# Altium footprint library Common Components.PcbLib: 94 footprints (part 2 of 6)
Each footprint in its own frame and in the unit in brackets; x right, y up, seen from the top. Pads: shape width x height; smd on the part's side, far side on the other; paste and mask are expansions set on the pad; w line width, h text height; cw(c..) or ccw(c..) is an arc to the next point about the centre after c.
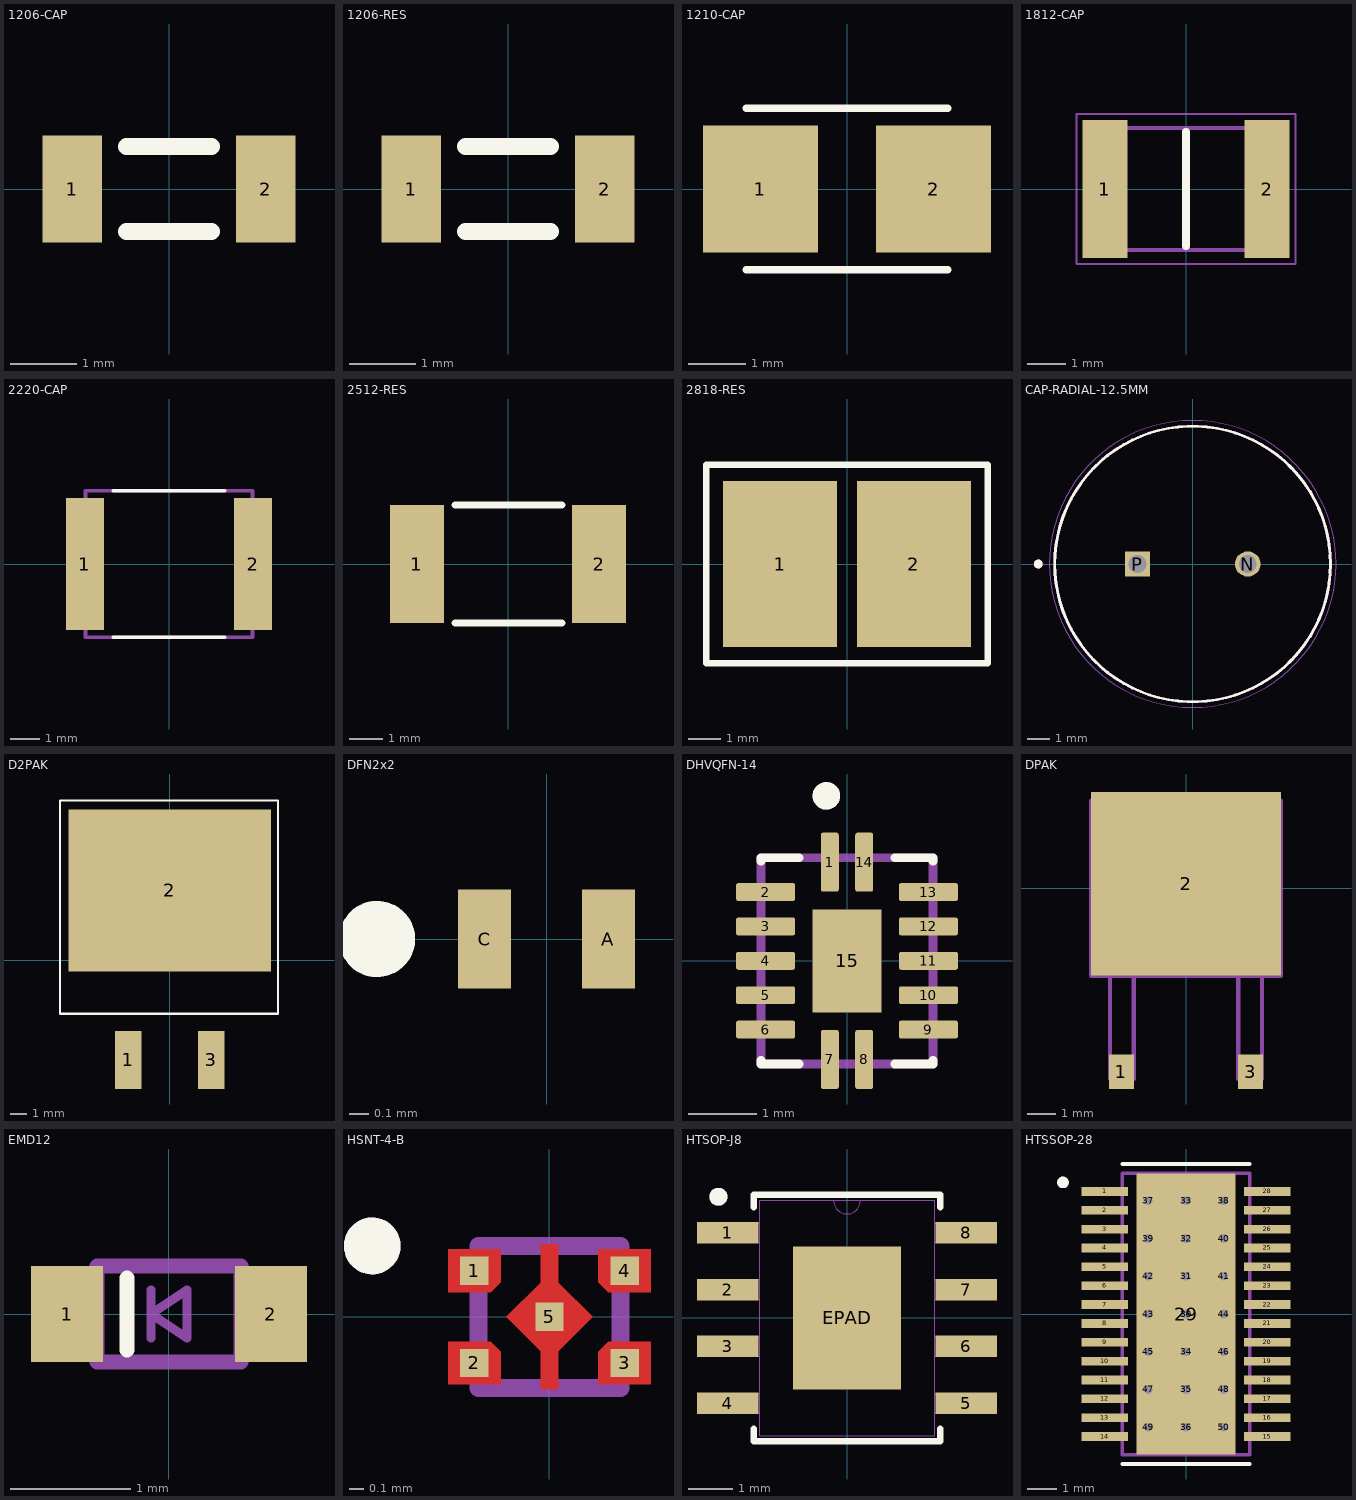
[diagram p1: the footprints below, top view; thin cyan lines are the x and y axes]

## 1206-CAP [mil]
pads (2):
  rect 35x63 smd: 1(-57,0) 2(57,0)
Top Overlay:
  lines w10: -25,-25 25,-25 ; -25,25 25,25
3D body "CAP_1206.step": height 31.21, standoff 0.5, extent -63,-31.5 62.99,31.49

## 1206-RES [mil]
pads (2):
  rect 35x63 smd: 1(-57,0) 2(57,0)
Top Overlay:
  lines w10: -25,-25 25,-25 ; -25,25 25,25
3D body "RES_1206.step": height 24.13, standoff 0.5, extent -63,-31.49 62.99,31.5

## 1210-CAP [mm]
pads (2):
  rect 2x2.2 smd: 1(-1.5,0) 2(1.5,0)
Top Overlay:
  lines w0.127: -1.75,-1.4 1.75,-1.4 ; -1.75,1.4 1.75,1.4
3D body "CAP_1210.step": height 0.79, standoff 0.01, extent -1.6,-1.25 1.6,1.25

## 1812-CAP [mm]
pads (2):
  rect 1.18x3.61 smd: 1(-2.12,0) 2(2.12,0)
Top Overlay:
  lines w0.2: 0,-1.5 0,1.5
Mechanical 13:
  lines w0.1: -2.3,-1.6 -2.3,1.6 2.3,1.6 2.3,-1.6 -2.3,-1.6
Mechanical 15:
  lines w0.05: -2.86,-1.96 -2.86,1.96 2.86,1.96 2.86,-1.96 -2.86,-1.96
3D body "1812B105K251CT.stp": height 2.2, standoff 0, extent -2.3,-1.6 2.3,1.6

## 2220-CAP [mm]
pads (2):
  rect 1.3x4.5 smd mask+0: 1(-2.875,0) 2(2.875,0)
Top Overlay:
  lines w0.127: -1.905,-2.5 1.905,-2.5 ; -1.905,2.5 1.905,2.5
Top Solder:
  region: 3.525,-2.25 2.225,-2.25 2.225,2.25 3.525,2.25
  region: -2.225,-2.25 -3.525,-2.25 -3.525,2.25 -2.225,2.25
Mechanical 13:
  lines w0.127: -2.85,-2.5 -2.85,2.5 2.85,2.5 2.85,-2.5 -2.85,-2.5
3D body "CAP_2220.step": height 1.01, standoff 0.01, extent -2.8,-2.5 2.8,2.5

## 2512-RES [mm]
pads (2):
  rect 1.6x3.5 smd: 1(-2.7,0) 2(2.7,0)
Top Overlay:
  lines w0.2: -1.575,-1.75 1.6,-1.75 ; -1.575,1.75 1.6,1.75
3D body "RES_2512.step": height 0.61, standoff 0.01, extent -3.2,-1.6 3.2,1.6

## 2818-RES [mm]
pads (2):
  rect 3.5x5.1 smd: 1(-2.055,0) 2(2.055,0)
Top Overlay:
  lines w0.2: -4.318,-3.048 -4.318,0.563 -4.318,3.048 4.318,3.048 4.318,-3.048 1.329,-3.048 -1.329,-3.048 -4.318,-3.048
3D body "WSHP2818.stp": height 1.51, standoff 0.01, extent -3.55,-2.286 3.55,2.314

## CAP-RADIAL-12.5MM [mm]
pads (2):
  round 1.15 hole 0.8: N(2.5,0)
  rect 1.15x1.15 hole 0.8: P(-2.5,0)
Top Overlay:
  circle w0.127: c0,0 r6.25
  circle w0.2: c-7,0 r0.1
Mechanical 13:
  circle w0.127: c0,0 r6.25
  circle w0.2: c-7,0 r0.1
Mechanical 15:
  circle w0.05: c0,0 r6.5
3D body "step_temp.STEP": height 27, standoff -19, extent -6.25,-6.25 6.25,6.25

## D2PAK [mm]
pads (3):
  rect 1.6x3.5 smd: 1(-2.5,-6) 3(2.5,-6)
  rect 12.2x9.75 smd: 2(0,4.2)
Top Overlay:
  lines w0.127: -6.6,-3.22 6.5,-3.22 6.5,9.6 -6.6,9.6 -6.6,-3.22
3D body "D2PAK.step": height 4.78, standoff -0.24, extent -5.08,-6.749 5.08,8.514

## DFN2x2 [mm]
pads (2):
  rect 0.28x0.52 smd: A(0.325,0) C(-0.325,0)
Top Overlay:
  circle w0.2: c-0.889,0 r0.1
3D body "X2DFN-2.STEP": height 0.53, standoff 0, extent -0.5,-0.3 0.5,0.3

## DHVQFN-14 [mm]
pads (15):
  rrect25% 0.26x0.86 smd: 1(-0.25,1.435) 7(-0.25,-1.435) 8(0.25,-1.435) 14(0.25,1.435)
  rrect25% 0.86x0.26 smd: 2(-1.185,1) 3(-1.185,0.5) 4(-1.185,0) 5(-1.185,-0.5) 6(-1.185,-1) 9(1.185,-1) 10(1.185,-0.5) 11(1.185,0) 12(1.185,0.5) 13(1.185,1)
  rect 1x1.5 smd paste-2: 15(0,0)
Top Overlay:
  circle w0.2: c-0.3,2.4 r0.1
  lines w0.127: -1.25,-1.45 -1.25,-1.5 -0.7,-1.5 ; -1.25,1.45 -1.25,1.5 -0.7,1.5 ; 0.7,-1.5 1.25,-1.5 1.25,-1.45 ; 0.7,1.5 1.25,1.5 1.25,1.45
Top Paste:
  region: 0.32,-0.47 -0.32,-0.47 -0.32,0.47 0.32,0.47
Mechanical 13:
  circle w0.2: c-0.3,2.4 r0.1
  lines w0.127: -1.25,-1.5 -1.25,1.5 1.25,1.5 1.25,-1.5 -1.25,-1.5
3D body "SOT762-1.step": height 0.86, standoff 0.01, extent -1.25,-1.501 1.252,1.501

## DPAK [mil]
pads (3):
  rect 35x48 smd: 1(-90,-256) 3(90,-256)
  rect 265x256 smd: 2(0,6)
Mechanical 13:
  lines w6: -132,-122 132,-122 132,122 -132,122 -132,-122 ; -106,-266 -106,-122 -73,-122 -73,-266 -106,-266 ; 73,-266 73,-122 106,-122 106,-266 73,-266
3D body "DPAK.step": height 95.42, standoff 0.5, extent -131.88,-277.31 131.9,130.26

## EMD12 [mm]
pads (2):
  rect 0.6x0.8 smd: 1(-0.85,0) 2(0.85,0)
Top Overlay:
  lines w0.127: -0.35,-0.3 -0.35,0.3
Mechanical 13:
  lines w0.076: -0.15,-0.2 -0.15,0.2 ; -0.15,0 0.15,0.2 0.15,-0.2 -0.15,0
  lines w0.127: -0.6,-0.4 -0.6,0.4 0.6,0.4 0.6,-0.4 -0.6,-0.4
3D body "EMD2.step": height 0.72, standoff 0, extent -0.859,-0.415 0.843,0.397

## HSNT-4-B [mm]
pads (5):
  rect 0.2x0.2 smd paste-1 mask+0: 1(-0.53,0.325) 2(-0.53,-0.325) 3(0.53,-0.325) 4(0.53,0.325)
  rect 0.2x0.2 smd paste+0.036 mask+0: 5(0,0)
Top Layer:
  region: 0.062,0.242 0.304,0 0.062,-0.242 0.062,-0.51 -0.062,-0.51 -0.062,-0.242 -0.304,0 -0.062,0.242 -0.062,0.51 0.062,0.51
  region: -0.345,-0.245 -0.345,-0.475 -0.715,-0.475 -0.715,-0.175 -0.415,-0.175
  region: 0.715,0.175 0.415,0.175 0.345,0.245 0.345,0.475 0.715,0.475
  region: 0.715,-0.475 0.345,-0.475 0.345,-0.245 0.415,-0.175 0.715,-0.175
  region: -0.345,0.245 -0.415,0.175 -0.715,0.175 -0.715,0.475 -0.345,0.475
Top Overlay:
  circle w0.2: c-1.25,0.5 r0.1
Top Paste:
  region: -0.345,-0.245 -0.345,-0.475 -0.715,-0.475 -0.715,-0.175 -0.415,-0.175
  region: 0.715,0.175 0.415,0.175 0.345,0.245 0.345,0.475 0.715,0.475
  region: 0.715,-0.475 0.345,-0.475 0.345,-0.245 0.415,-0.175 0.715,-0.175
  region: -0.345,0.245 -0.415,0.175 -0.715,0.175 -0.715,0.475 -0.345,0.475
Top Solder:
  region: 0.112,0.262 0.375,0 0.112,-0.262 0.112,-0.56 -0.112,-0.56 -0.112,-0.262 -0.375,0 -0.112,0.262 -0.112,0.56 0.112,0.56
  region: -0.295,-0.195 -0.295,-0.525 -0.765,-0.525 -0.765,-0.125 -0.365,-0.125
  region: 0.765,0.125 0.365,0.125 0.295,0.195 0.295,0.525 0.765,0.525
  region: 0.765,-0.525 0.295,-0.525 0.295,-0.195 0.365,-0.125 0.765,-0.125
  region: -0.295,0.195 -0.365,0.125 -0.765,0.125 -0.765,0.525 -0.295,0.525
Mechanical 13:
  circle w0.2: c-1.25,0.5 r0.1
  lines w0.127: -0.5,-0.5 -0.5,0.5 0.5,0.5 0.5,-0.5 -0.5,-0.5
3D body "HSNT-4-B.STEP": height 0.38, standoff 0, extent -0.53,-0.505 0.53,0.505

## HTSOP-J8 [mil]
pads (9):
  rect 54x19 smd paste+0: 1(-105,75) 2(-105,25) 3(-105,-25) 4(-105,-75) 5(105,-75) 6(105,-25) 7(105,25) 8(105,75)
  rect 95x126 smd paste-62.5: EPAD(0,0)
Top Overlay:
  circle w7.87: c-113.13,106.67 r3.94
  lines w6: -82,-97.6 -82,-108.5 82,-108.5 82,-97.6 ; -82,97.6 -82,108.5 82,108.5 82,97.6
Top Paste:
  region: 43.56,59.06 -43.56,59.06 -43.56,3.94 43.56,3.94
  region: 43.56,-3.94 -43.56,-3.94 -43.56,-59.06 43.56,-59.06
Mechanical 13:
  circle w7.87: c-113.13,106.67 r3.94
  circle w7.87: c-113.13,106.67 r3.94
  lines w0: -12,103.5 ccw(c0,103.5) 12,103.5
  lines w1: -118,-83.5 -118,-66.5 -77,-66.5 -77,-83.5 -118,-83.5 ; -118,-33.5 -118,-16.5 -77,-16.5 -77,-33.5 -118,-33.5 ; -118,16.5 -118,33.5 -77,33.5 -77,16.5 -118,16.5 ; -118,66.5 -118,83.5 -77,83.5 -77,66.5 -118,66.5 ; -77,-103.5 77,-103.5 77,103.5 -77,103.5 -77,-103.5 ; 77,-83.5 77,-66.5 118,-66.5 118,-83.5 77,-83.5 ; 77,-33.5 77,-16.5 118,-16.5 118,-33.5 77,-33.5 ; 77,16.5 77,33.5 118,33.5 118,16.5 77,16.5 ; 77,66.5 77,83.5 118,83.5 118,66.5 77,66.5
3D body: height 10, standoff 0, extent 0,0 10,10
3D body "HTSOP-J8_ROM.step": height 39.09, standoff 0, extent -118,-103.5 117.99,103.5

## HTSSOP-28 [mm]
pads (50):
  rect 1.6x0.3 smd: 1(-2.8,4.225) 2(-2.8,3.575) 3(-2.8,2.925) 4(-2.8,2.275) 5(-2.8,1.625) 6(-2.8,0.975) 7(-2.8,0.325) 8(-2.8,-0.325) 9(-2.8,-0.975) 10(-2.8,-1.625) 11(-2.8,-2.275) 12(-2.8,-2.925) 13(-2.8,-3.575) 14(-2.8,-4.225) 15(2.8,-4.225) 16(2.8,-3.575) 17(2.8,-2.925) 18(2.8,-2.275) 19(2.8,-1.625) 20(2.8,-0.975) 21(2.8,-0.325) 22(2.8,0.325) 23(2.8,0.975) 24(2.8,1.625) 25(2.8,2.275) 26(2.8,2.925) 27(2.8,3.575) 28(2.8,4.225)
  rect 3.4x9.7 smd: 29(0,0)
  round 0.5 hole 0.3: 30(0,0) 31(0,1.3) 32(0,2.6) 33(0,3.9) 34(0,-1.3) 35(0,-2.6) 36(0,-3.9) 37(-1.3,3.9) 38(1.3,3.9) 39(-1.3,2.6) 40(1.3,2.6) 41(1.3,1.3) 42(-1.3,1.3) 43(-1.3,0) 44(1.3,0) 45(-1.3,-1.3) 46(1.3,-1.3) 47(-1.3,-2.6) 48(1.3,-2.6) 49(-1.3,-3.9) 50(1.3,-3.9)
Top Overlay:
  circle w0.2: c-4.24,4.535 r0.1
  lines w0.127: -2.2,-5.17 2.2,-5.17 ; -2.2,5.17 2.2,5.17
Top Paste:
  region: 2.025,-4.1 3.575,-4.1 3.575,-4.35 2.025,-4.35
  region: 2.025,-3.45 3.575,-3.45 3.575,-3.7 2.025,-3.7
  region: 2.025,-2.8 3.575,-2.8 3.575,-3.05 2.025,-3.05
  region: 2.025,-2.15 3.575,-2.15 3.575,-2.4 2.025,-2.4
  region: 2.025,-1.5 3.575,-1.5 3.575,-1.75 2.025,-1.75
  region: 2.025,-0.85 3.575,-0.85 3.575,-1.1 2.025,-1.1
  region: 2.025,-0.2 3.575,-0.2 3.575,-0.45 2.025,-0.45
  region: -3.575,-4.1 -2.025,-4.1 -2.025,-4.35 -3.575,-4.35
  region: -3.575,-3.45 -2.025,-3.45 -2.025,-3.7 -3.575,-3.7
  region: -3.575,-2.8 -2.025,-2.8 -2.025,-3.05 -3.575,-3.05
  region: -3.575,-2.15 -2.025,-2.15 -2.025,-2.4 -3.575,-2.4
  region: -3.575,-1.5 -2.025,-1.5 -2.025,-1.75 -3.575,-1.75
  region: -3.575,-0.85 -2.025,-0.85 -2.025,-1.1 -3.575,-1.1
  region: -3.575,-0.2 -2.025,-0.2 -2.025,-0.45 -3.575,-0.45
  region: 2.025,0.45 3.575,0.45 3.575,0.2 2.025,0.2
  region: -3.575,0.45 -2.025,0.45 -2.025,0.2 -3.575,0.2
  region: 2.025,1.1 3.575,1.1 3.575,0.85 2.025,0.85
  region: -3.575,1.1 -2.025,1.1 -2.025,0.85 -3.575,0.85
  region: 2.025,1.75 3.575,1.75 3.575,1.5 2.025,1.5
  region: -3.575,1.75 -2.025,1.75 -2.025,1.5 -3.575,1.5
  region: 2.025,2.4 3.575,2.4 3.575,2.15 2.025,2.15
  region: -3.575,2.4 -2.025,2.4 -2.025,2.15 -3.575,2.15
  region: 2.025,3.05 3.575,3.05 3.575,2.8 2.025,2.8
  region: -3.575,3.05 -2.025,3.05 -2.025,2.8 -3.575,2.8
  region: 2.025,3.7 3.575,3.7 3.575,3.45 2.025,3.45
  region: -3.575,3.7 -2.025,3.7 -2.025,3.45 -3.575,3.45
  region: 2.025,4.35 3.575,4.35 3.575,4.1 2.025,4.1
  region: -3.575,4.35 -2.025,4.35 -2.025,4.1 -3.575,4.1
  region: -1.2,3.23 1.2,3.23 1.2,-3.23 -1.2,-3.23
Top Solder:
  region: 1.93,-4.005 3.67,-4.005 3.67,-4.445 1.93,-4.445
  region: 1.93,-3.355 3.67,-3.355 3.67,-3.795 1.93,-3.795
  region: 1.93,-2.705 3.67,-2.705 3.67,-3.145 1.93,-3.145
  region: 1.93,-2.055 3.67,-2.055 3.67,-2.495 1.93,-2.495
  region: 1.93,-1.405 3.67,-1.405 3.67,-1.845 1.93,-1.845
  region: 1.93,-0.755 3.67,-0.755 3.67,-1.195 1.93,-1.195
  region: 1.93,-0.105 3.67,-0.105 3.67,-0.545 1.93,-0.545
  region: -3.67,-4.005 -1.93,-4.005 -1.93,-4.445 -3.67,-4.445
  region: -3.67,-3.355 -1.93,-3.355 -1.93,-3.795 -3.67,-3.795
  region: -3.67,-2.705 -1.93,-2.705 -1.93,-3.145 -3.67,-3.145
  region: -3.67,-2.055 -1.93,-2.055 -1.93,-2.495 -3.67,-2.495
  region: -3.67,-1.405 -1.93,-1.405 -1.93,-1.845 -3.67,-1.845
  region: -3.67,-0.755 -1.93,-0.755 -1.93,-1.195 -3.67,-1.195
  region: -3.67,-0.105 -1.93,-0.105 -1.93,-0.545 -3.67,-0.545
  region: 1.93,0.545 3.67,0.545 3.67,0.105 1.93,0.105
  region: -3.67,0.545 -1.93,0.545 -1.93,0.105 -3.67,0.105
  region: 1.93,1.195 3.67,1.195 3.67,0.755 1.93,0.755
  region: -3.67,1.195 -1.93,1.195 -1.93,0.755 -3.67,0.755
  region: 1.93,1.845 3.67,1.845 3.67,1.405 1.93,1.405
  region: -3.67,1.845 -1.93,1.845 -1.93,1.405 -3.67,1.405
  region: 1.93,2.495 3.67,2.495 3.67,2.055 1.93,2.055
  region: -3.67,2.495 -1.93,2.495 -1.93,2.055 -3.67,2.055
  region: 1.93,3.145 3.67,3.145 3.67,2.705 1.93,2.705
  region: -3.67,3.145 -1.93,3.145 -1.93,2.705 -3.67,2.705
  region: 1.93,3.795 3.67,3.795 3.67,3.355 1.93,3.355
  region: -3.67,3.795 -1.93,3.795 -1.93,3.355 -3.67,3.355
  region: 1.93,4.445 3.67,4.445 3.67,4.005 1.93,4.005
  region: -3.67,4.445 -1.93,4.445 -1.93,4.005 -3.67,4.005
  region: -1.2,3.23 1.2,3.23 1.2,-3.23 -1.2,-3.23
Mechanical 13:
  circle w0.2: c-4.24,4.535 r0.1
  circle w0.2: c-4.24,4.535 r0.1
  lines w0.127: -2.2,-4.85 -2.2,4.85 ; -2.2,-4.85 2.2,-4.85 ; -2.2,-4.85 -2.2,4.85 ; -2.2,-4.85 2.2,-4.85 ; -2.2,4.85 2.2,4.85 ; -2.2,4.85 2.2,4.85 ; 2.2,-4.85 2.2,4.85 ; 2.2,-4.85 2.2,4.85
3D body "HTSSOP-28.STEP": height 1.21, standoff 0.01, extent -3.31,-4.9 3.31,4.9